# Altium footprint library SMD_SEMI.PcbLib: 101 footprints (part 1 of 7)
Each footprint in its own frame and in the unit in brackets; x right, y up, seen from the top. Pads: shape width x height; smd on the part's side, far side on the other; paste and mask are expansions set on the pad; w line width, h text height; cw(c..) or ccw(c..) is an arc to the next point about the centre after c.
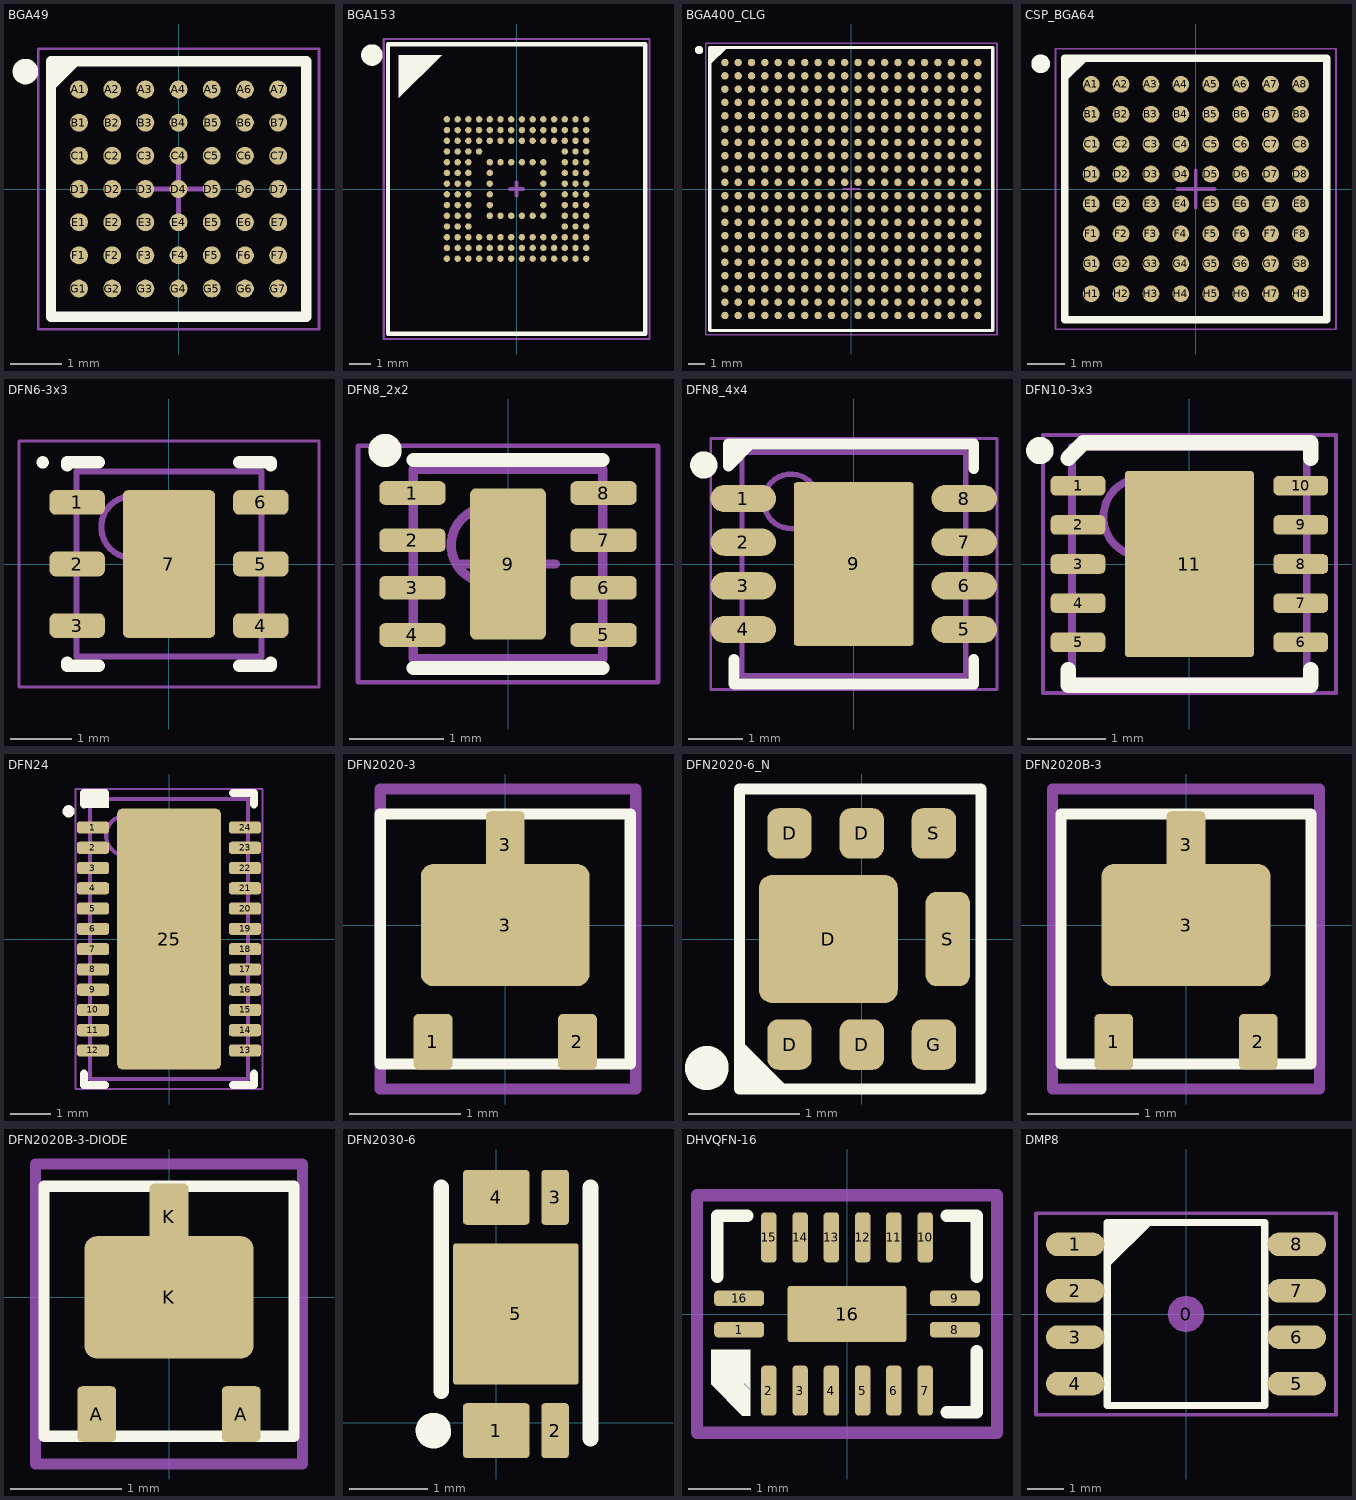
[diagram p0: the footprints below, top view; thin cyan lines are the x and y axes]

## BGA49 [mm] "BGA, 49-Leads, Body 5,00x5,00mmx1,38mm, Pitch 0,65mm"
height 1.38
pads (49):
  round 0.35 smd: A1(-1.95,1.95) A2(-1.3,1.95) A3(-0.65,1.95) A4(0,1.95) A5(0.65,1.95) A6(1.3,1.95) A7(1.95,1.95) B1(-1.95,1.3) B2(-1.3,1.3) B3(-0.65,1.3) B4(0,1.3) B5(0.65,1.3) B6(1.3,1.3) B7(1.95,1.3) C1(-1.95,0.65) C2(-1.3,0.65) C3(-0.65,0.65) C4(0,0.65) C5(0.65,0.65) C6(1.3,0.65) C7(1.95,0.65) D1(-1.95,0) D2(-1.3,0) D3(-0.65,0) D4(0,0) D5(0.65,0) D6(1.3,0) D7(1.95,0) E1(-1.95,-0.65) E2(-1.3,-0.65) E3(-0.65,-0.65) E4(0,-0.65) E5(0.65,-0.65) E6(1.3,-0.65) E7(1.95,-0.65) F1(-1.95,-1.3) F2(-1.3,-1.3) F3(-0.65,-1.3) F4(0,-1.3) F5(0.65,-1.3) F6(1.3,-1.3) F7(1.95,-1.3) G1(-1.95,-1.95) G2(-1.3,-1.95) G3(-0.65,-1.95) G4(0,-1.95) G5(0.65,-1.95) G6(1.3,-1.95) G7(1.95,-1.95)
Top Overlay:
  circle w0.25: c-3,2.3 r0.125
  region: -2.5,2.5 -1.885,2.5 -2.5,1.885
  region: -2.213,2.5 -2.5,2.213 -2.5,2.5
  lines w0.2: -2.5,2.213 -2.213,2.5 ; -2.5,-2.5 -2.5,2.5 2.5,2.5 2.5,-2.5 -2.5,-2.5
Mechanical 13:
  lines w0.1: -2.5,-2.5 -2.5,2.5 2.5,2.5 2.5,-2.5 -2.5,-2.5
Mechanical 15:
  lines w0.05: -2.75,-2.75 -2.75,2.75 2.75,2.75 2.75,-2.75 -2.75,-2.75
  lines w0.1: -0.5,0 0.5,0 ; 0,-0.5 0,0.5
3D body "BGA49.step": height 1.38, standoff 0, extent -2.5,-2.5 2.5,2.5

## BGA153 [mm]
pads (153):
  round 0.3 smd mask+0.025: A1(-3.25,3.25) A2(-2.75,3.25) A3(-2.25,3.25) A4(-1.75,3.25) A5(-1.25,3.25) A6(-0.75,3.25) A7(-0.25,3.25) A8(0.25,3.25) A9(0.75,3.25) A10(1.25,3.25) A11(1.75,3.25) A12(2.25,3.25) A13(2.75,3.25) A14(3.25,3.25) B1(-3.25,2.75) B2(-2.75,2.75) B3(-2.25,2.75) B4(-1.75,2.75) B5(-1.25,2.75) B6(-0.75,2.75) B7(-0.25,2.75) B8(0.25,2.75) B9(0.75,2.75) B10(1.25,2.75) B11(1.75,2.75) B12(2.25,2.75) B13(2.75,2.75) B14(3.25,2.75) C1(-3.25,2.25) C2(-2.75,2.25) C3(-2.25,2.25) C4(-1.75,2.25) C5(-1.25,2.25) C6(-0.75,2.25) C7(-0.25,2.25) C8(0.25,2.25) C9(0.75,2.25) C10(1.25,2.25) C11(1.75,2.25) C12(2.25,2.25) C13(2.75,2.25) C14(3.25,2.25) D1(-3.25,1.75) D2(-2.75,1.75) D3(-2.25,1.75) D4(-1.75,1.75) D12(2.25,1.75) D13(2.75,1.75) D14(3.25,1.75) E1(-3.25,1.25) E2(-2.75,1.25) E3(-2.25,1.25) E5(-1.25,1.25) E6(-0.75,1.25) E7(-0.25,1.25) E8(0.25,1.25) E9(0.75,1.25) E10(1.25,1.25) E12(2.25,1.25) E13(2.75,1.25) E14(3.25,1.25) F1(-3.25,0.75) F2(-2.75,0.75) F3(-2.25,0.75) F5(-1.25,0.75) F10(1.25,0.75) F12(2.25,0.75) F13(2.75,0.75) F14(3.25,0.75) G1(-3.25,0.25) G2(-2.75,0.25) G3(-2.25,0.25) G5(-1.25,0.25) G10(1.25,0.25) G12(2.25,0.25) G13(2.75,0.25) G14(3.25,0.25) H1(-3.25,-0.25) H2(-2.75,-0.25) H3(-2.25,-0.25) H5(-1.25,-0.25) H10(1.25,-0.25) H12(2.25,-0.25) H13(2.75,-0.25) H14(3.25,-0.25) J1(-3.25,-0.75) J2(-2.75,-0.75) J3(-2.25,-0.75) J5(-1.25,-0.75) J10(1.25,-0.75) J12(2.25,-0.75) J13(2.75,-0.75) J14(3.25,-0.75) K1(-3.25,-1.25) K2(-2.75,-1.25) K3(-2.25,-1.25) K5(-1.25,-1.25) K6(-0.75,-1.25) K7(-0.25,-1.25) K8(0.25,-1.25) K9(0.75,-1.25) K10(1.25,-1.25) K12(2.25,-1.25) K13(2.75,-1.25) K14(3.25,-1.25) L1(-3.25,-1.75) L2(-2.75,-1.75) L3(-2.25,-1.75) L12(2.25,-1.75) L13(2.75,-1.75) L14(3.25,-1.75) M1(-3.25,-2.25) M2(-2.75,-2.25) M3(-2.25,-2.25) M4(-1.75,-2.25) M5(-1.25,-2.25) M6(-0.75,-2.25) M7(-0.25,-2.25) M8(0.25,-2.25) M9(0.75,-2.25) M10(1.25,-2.25) M11(1.75,-2.25) M12(2.25,-2.25) M13(2.75,-2.25) M14(3.25,-2.25) N1(-3.25,-2.75) N2(-2.75,-2.75) N3(-2.25,-2.75) N4(-1.75,-2.75) N5(-1.25,-2.75) N6(-0.75,-2.75) N7(-0.25,-2.75) N8(0.25,-2.75) N9(0.75,-2.75) N10(1.25,-2.75) N11(1.75,-2.75) N12(2.25,-2.75) N13(2.75,-2.75) N14(3.25,-2.75) P1(-3.25,-3.25) P2(-2.75,-3.25) P3(-2.25,-3.25) P4(-1.75,-3.25) P5(-1.25,-3.25) P6(-0.75,-3.25) P7(-0.25,-3.25) P8(0.25,-3.25) P9(0.75,-3.25) P10(1.25,-3.25) P11(1.75,-3.25) P12(2.25,-3.25) P13(2.75,-3.25) P14(3.25,-3.25)
Top Overlay:
  circle w0.5: c-6.75,6.25 r0.25
  region: -5.5,6.25 -3.5,6.25 -5.5,4.25
  lines w0.2: -6,-6.75 6,-6.75 6,6.75 -6,6.75 -6,-6.75
Mechanical 15:
  lines w0.1: -6.2,-7 6.2,-7 6.2,7 -6.2,7 -6.2,-7
  lines w0.2: -0.3,0 0.3,0 ; 0,-0.3 0,0.3
3D body "User Library-153BallWFBGA.step": height 0.77, standoff -0.03, extent -5.75,-6.5 5.75,6.5

## BGA400_CLG [mm] "BGA, 400-Leads, Body 17,00x17,00mmx1,60mm, Pitch 0,80mm"
height 1.6
pads (400):
  round 0.45 smd: A1(-7.6,7.6) A2(-6.8,7.6) A3(-6,7.6) A4(-5.2,7.6) A5(-4.4,7.6) A6(-3.6,7.6) A7(-2.8,7.6) A8(-2,7.6) A9(-1.2,7.6) A10(-0.4,7.6) A11(0.4,7.6) A12(1.2,7.6) A13(2,7.6) A14(2.8,7.6) A15(3.6,7.6) A16(4.4,7.6) A17(5.2,7.6) A18(6,7.6) A19(6.8,7.6) A20(7.6,7.6) B1(-7.6,6.8) B2(-6.8,6.8) B3(-6,6.8) B4(-5.2,6.8) B5(-4.4,6.8) B6(-3.6,6.8) B7(-2.8,6.8) B8(-2,6.8) B9(-1.2,6.8) B10(-0.4,6.8) B11(0.4,6.8) B12(1.2,6.8) B13(2,6.8) B14(2.8,6.8) B15(3.6,6.8) B16(4.4,6.8) B17(5.2,6.8) B18(6,6.8) B19(6.8,6.8) B20(7.6,6.8) C1(-7.6,6) C2(-6.8,6) C3(-6,6) C4(-5.2,6) C5(-4.4,6) C6(-3.6,6) C7(-2.8,6) C8(-2,6) C9(-1.2,6) C10(-0.4,6) C11(0.4,6) C12(1.2,6) C13(2,6) C14(2.8,6) C15(3.6,6) C16(4.4,6) C17(5.2,6) C18(6,6) C19(6.8,6) C20(7.6,6) D1(-7.6,5.2) D2(-6.8,5.2) D3(-6,5.2) D4(-5.2,5.2) D5(-4.4,5.2) D6(-3.6,5.2) D7(-2.8,5.2) D8(-2,5.2) D9(-1.2,5.2) D10(-0.4,5.2) D11(0.4,5.2) D12(1.2,5.2) D13(2,5.2) D14(2.8,5.2) D15(3.6,5.2) D16(4.4,5.2) D17(5.2,5.2) D18(6,5.2) D19(6.8,5.2) D20(7.6,5.2) E1(-7.6,4.4) E2(-6.8,4.4) E3(-6,4.4) E4(-5.2,4.4) E5(-4.4,4.4) E6(-3.6,4.4) E7(-2.8,4.4) E8(-2,4.4) E9(-1.2,4.4) E10(-0.4,4.4) E11(0.4,4.4) E12(1.2,4.4) E13(2,4.4) E14(2.8,4.4) E15(3.6,4.4) E16(4.4,4.4) E17(5.2,4.4) E18(6,4.4) E19(6.8,4.4) E20(7.6,4.4) F1(-7.6,3.6) F2(-6.8,3.6) F3(-6,3.6) F4(-5.2,3.6) F5(-4.4,3.6) F6(-3.6,3.6) F7(-2.8,3.6) F8(-2,3.6) F9(-1.2,3.6) F10(-0.4,3.6) F11(0.4,3.6) F12(1.2,3.6) F13(2,3.6) F14(2.8,3.6) F15(3.6,3.6) F16(4.4,3.6) F17(5.2,3.6) F18(6,3.6) F19(6.8,3.6) F20(7.6,3.6) G1(-7.6,2.8) G2(-6.8,2.8) G3(-6,2.8) G4(-5.2,2.8) G5(-4.4,2.8) G6(-3.6,2.8) G7(-2.8,2.8) G8(-2,2.8) G9(-1.2,2.8) G10(-0.4,2.8) G11(0.4,2.8) G12(1.2,2.8) G13(2,2.8) G14(2.8,2.8) G15(3.6,2.8) G16(4.4,2.8) G17(5.2,2.8) G18(6,2.8) G19(6.8,2.8) G20(7.6,2.8) H1(-7.6,2) H2(-6.8,2) H3(-6,2) H4(-5.2,2) H5(-4.4,2) H6(-3.6,2) H7(-2.8,2) H8(-2,2) H9(-1.2,2) H10(-0.4,2) H11(0.4,2) H12(1.2,2) H13(2,2) H14(2.8,2) H15(3.6,2) H16(4.4,2) H17(5.2,2) H18(6,2) H19(6.8,2) H20(7.6,2) J1(-7.6,1.2) J2(-6.8,1.2) J3(-6,1.2) J4(-5.2,1.2) J5(-4.4,1.2) J6(-3.6,1.2) J7(-2.8,1.2) J8(-2,1.2) J9(-1.2,1.2) J10(-0.4,1.2) J11(0.4,1.2) J12(1.2,1.2) J13(2,1.2) J14(2.8,1.2) J15(3.6,1.2) J16(4.4,1.2) J17(5.2,1.2) J18(6,1.2) J19(6.8,1.2) J20(7.6,1.2) K1(-7.6,0.4) K2(-6.8,0.4) K3(-6,0.4) K4(-5.2,0.4) K5(-4.4,0.4) K6(-3.6,0.4) K7(-2.8,0.4) K8(-2,0.4) K9(-1.2,0.4) K10(-0.4,0.4) K11(0.4,0.4) K12(1.2,0.4) K13(2,0.4) K14(2.8,0.4) K15(3.6,0.4) K16(4.4,0.4) K17(5.2,0.4) K18(6,0.4) K19(6.8,0.4) K20(7.6,0.4) L1(-7.6,-0.4) L2(-6.8,-0.4) L3(-6,-0.4) L4(-5.2,-0.4) L5(-4.4,-0.4) L6(-3.6,-0.4) L7(-2.8,-0.4) L8(-2,-0.4) L9(-1.2,-0.4) L10(-0.4,-0.4) L11(0.4,-0.4) L12(1.2,-0.4) L13(2,-0.4) L14(2.8,-0.4) L15(3.6,-0.4) L16(4.4,-0.4) L17(5.2,-0.4) L18(6,-0.4) L19(6.8,-0.4) L20(7.6,-0.4) M1(-7.6,-1.2) M2(-6.8,-1.2) M3(-6,-1.2) M4(-5.2,-1.2) M5(-4.4,-1.2) M6(-3.6,-1.2) M7(-2.8,-1.2) M8(-2,-1.2) M9(-1.2,-1.2) M10(-0.4,-1.2) M11(0.4,-1.2) M12(1.2,-1.2) M13(2,-1.2) M14(2.8,-1.2) M15(3.6,-1.2) M16(4.4,-1.2) M17(5.2,-1.2) M18(6,-1.2) M19(6.8,-1.2) M20(7.6,-1.2) N1(-7.6,-2) N2(-6.8,-2) N3(-6,-2) N4(-5.2,-2) N5(-4.4,-2) N6(-3.6,-2) N7(-2.8,-2) N8(-2,-2) N9(-1.2,-2) N10(-0.4,-2) N11(0.4,-2) N12(1.2,-2) N13(2,-2) N14(2.8,-2) N15(3.6,-2) N16(4.4,-2) N17(5.2,-2) N18(6,-2) N19(6.8,-2) N20(7.6,-2) P1(-7.6,-2.8) P2(-6.8,-2.8) P3(-6,-2.8) P4(-5.2,-2.8) P5(-4.4,-2.8) P6(-3.6,-2.8) P7(-2.8,-2.8) P8(-2,-2.8) P9(-1.2,-2.8) P10(-0.4,-2.8) P11(0.4,-2.8) P12(1.2,-2.8) P13(2,-2.8) P14(2.8,-2.8) P15(3.6,-2.8) P16(4.4,-2.8) P17(5.2,-2.8) P18(6,-2.8) P19(6.8,-2.8) P20(7.6,-2.8) R1(-7.6,-3.6) R2(-6.8,-3.6) R3(-6,-3.6) R4(-5.2,-3.6) R5(-4.4,-3.6) R6(-3.6,-3.6) R7(-2.8,-3.6) R8(-2,-3.6) R9(-1.2,-3.6) R10(-0.4,-3.6) R11(0.4,-3.6) R12(1.2,-3.6) R13(2,-3.6) R14(2.8,-3.6) R15(3.6,-3.6) R16(4.4,-3.6) R17(5.2,-3.6) R18(6,-3.6) R19(6.8,-3.6) R20(7.6,-3.6) T1(-7.6,-4.4) T2(-6.8,-4.4) T3(-6,-4.4) T4(-5.2,-4.4) T5(-4.4,-4.4) T6(-3.6,-4.4) T7(-2.8,-4.4) T8(-2,-4.4) T9(-1.2,-4.4) T10(-0.4,-4.4) T11(0.4,-4.4) T12(1.2,-4.4) T13(2,-4.4) T14(2.8,-4.4) T15(3.6,-4.4) T16(4.4,-4.4) T17(5.2,-4.4) T18(6,-4.4) T19(6.8,-4.4) T20(7.6,-4.4) U1(-7.6,-5.2) U2(-6.8,-5.2) U3(-6,-5.2) U4(-5.2,-5.2) U5(-4.4,-5.2) U6(-3.6,-5.2) U7(-2.8,-5.2) U8(-2,-5.2) U9(-1.2,-5.2) U10(-0.4,-5.2) U11(0.4,-5.2) U12(1.2,-5.2) U13(2,-5.2) U14(2.8,-5.2) U15(3.6,-5.2) U16(4.4,-5.2) U17(5.2,-5.2) U18(6,-5.2) U19(6.8,-5.2) U20(7.6,-5.2) V1(-7.6,-6) V2(-6.8,-6) V3(-6,-6) V4(-5.2,-6) V5(-4.4,-6) V6(-3.6,-6) V7(-2.8,-6) V8(-2,-6) V9(-1.2,-6) V10(-0.4,-6) V11(0.4,-6) V12(1.2,-6) V13(2,-6) V14(2.8,-6) V15(3.6,-6) V16(4.4,-6) V17(5.2,-6) V18(6,-6) V19(6.8,-6) V20(7.6,-6) W1(-7.6,-6.8) W2(-6.8,-6.8) W3(-6,-6.8) W4(-5.2,-6.8) W5(-4.4,-6.8) W6(-3.6,-6.8) W7(-2.8,-6.8) W8(-2,-6.8) W9(-1.2,-6.8) W10(-0.4,-6.8) W11(0.4,-6.8) W12(1.2,-6.8) W13(2,-6.8) W14(2.8,-6.8) W15(3.6,-6.8) W16(4.4,-6.8) W17(5.2,-6.8) W18(6,-6.8) W19(6.8,-6.8) W20(7.6,-6.8) Y1(-7.6,-7.6) Y2(-6.8,-7.6) Y3(-6,-7.6) Y4(-5.2,-7.6) Y5(-4.4,-7.6) Y6(-3.6,-7.6) Y7(-2.8,-7.6) Y8(-2,-7.6) Y9(-1.2,-7.6) Y10(-0.4,-7.6) Y11(0.4,-7.6) Y12(1.2,-7.6) Y13(2,-7.6) Y14(2.8,-7.6) Y15(3.6,-7.6) Y16(4.4,-7.6) Y17(5.2,-7.6) Y18(6,-7.6) Y19(6.8,-7.6) Y20(7.6,-7.6)
Top Overlay:
  circle w0.25: c-9.15,8.35 r0.125
  region: -7.584,8.5 -8.5,7.584 -8.5,8.5
  lines w0.2: -8.5,7.584 -7.584,8.5 ; -8.5,-8.5 -8.5,8.5 8.5,8.5 8.5,-8.5 -8.5,-8.5
Mechanical 13:
  lines w0.1: -8.5,-8.5 -8.5,8.5 8.5,8.5 8.5,-8.5 -8.5,-8.5
Mechanical 15:
  lines w0.1: -0.5,0 0.5,0 ; 0,-0.5 0,0.5 ; -8.75,-8.75 -8.75,8.75 8.75,8.75 8.75,-8.75 -8.75,-8.75
3D body "BGA400_CLG.step": height 1.6, standoff 0, extent -8.5,-8.5 8.5,8.5

## CSP_BGA64 [mm] "BGA, 64-Leads, Body 7,00x7,00mmx2,00mm, Pitch 0,80mm"
height 2
pads (64):
  round 0.45 smd: A1(-2.8,2.8) A2(-2,2.8) A3(-1.2,2.8) A4(-0.4,2.8) A5(0.4,2.8) A6(1.2,2.8) A7(2,2.8) A8(2.8,2.8) B1(-2.8,2) B2(-2,2) B3(-1.2,2) B4(-0.4,2) B5(0.4,2) B6(1.2,2) B7(2,2) B8(2.8,2) C1(-2.8,1.2) C2(-2,1.2) C3(-1.2,1.2) C4(-0.4,1.2) C5(0.4,1.2) C6(1.2,1.2) C7(2,1.2) C8(2.8,1.2) D1(-2.8,0.4) D2(-2,0.4) D3(-1.2,0.4) D4(-0.4,0.4) D5(0.4,0.4) D6(1.2,0.4) D7(2,0.4) D8(2.8,0.4) E1(-2.8,-0.4) E2(-2,-0.4) E3(-1.2,-0.4) E4(-0.4,-0.4) E5(0.4,-0.4) E6(1.2,-0.4) E7(2,-0.4) E8(2.8,-0.4) F1(-2.8,-1.2) F2(-2,-1.2) F3(-1.2,-1.2) F4(-0.4,-1.2) F5(0.4,-1.2) F6(1.2,-1.2) F7(2,-1.2) F8(2.8,-1.2) G1(-2.8,-2) G2(-2,-2) G3(-1.2,-2) G4(-0.4,-2) G5(0.4,-2) G6(1.2,-2) G7(2,-2) G8(2.8,-2) H1(-2.8,-2.8) H2(-2,-2.8) H3(-1.2,-2.8) H4(-0.4,-2.8) H5(0.4,-2.8) H6(1.2,-2.8) H7(2,-2.8) H8(2.8,-2.8)
Top Overlay:
  circle w0.25: c-4.15,3.35 r0.125
  region: -2.984,3.5 -3.5,2.984 -3.5,3.5
  lines w0.2: -3.5,2.984 -2.984,3.5 ; -3.5,-3.5 3.5,-3.5 3.5,3.5 -3.5,3.5 -3.5,-3.5
Mechanical 13:
  lines w0.1: -3.5,-3.5 3.5,-3.5 3.5,3.5 -3.5,3.5 -3.5,-3.5
Mechanical 15:
  lines w0.05: -3.75,-3.75 3.75,-3.75 3.75,3.75 -3.75,3.75 -3.75,-3.75
  lines w0.1: -0.5,0 0.5,0 ; 0,-0.5 0,0.5
3D body "CSP_BGA64.step": height 2, standoff 0, extent -3.5,-3.5 3.5,3.5

## DFN6-3x3 [mm]
height 1.21
pads (7):
  rrect50% 0.9x0.4 smd: 1(-1.49,1) 2(-1.49,0) 3(-1.49,-1) 4(1.49,-1) 5(1.49,0) 6(1.49,1)
  rrect12% 1.5x2.4 smd: 7(0,0)
Top Overlay:
  circle w0.1: c-2.05,1.65 r0.05
  lines w0.2: -1.65,-1.6 -1.65,-1.65 -1.14,-1.65 ; -1.65,1.6 -1.65,1.65 -1.14,1.65 ; 1.14,-1.65 1.65,-1.65 1.65,-1.6 ; 1.14,1.65 1.65,1.65 1.65,1.6
Mechanical 13:
  circle w0.1: c-0.6,0.6 r0.5
  lines w0.1: -1.5,-1.5 -1.5,1.5 1.5,1.5 1.5,-1.5 -1.5,-1.5
Mechanical 15:
  lines w0.05: -2.435,-2 -2.435,2 2.435,2 2.435,-2 -2.435,-2
  lines w0.1: -0.5,0 0.5,0 ; 0,-0.5 0,0.5
3D body "DFN6-3x3_1.step": height 1.21, standoff 0, extent -1.6,-1.5 1.6,1.5

## DFN8_2x2 [mm] "SON, 8-Leads, Body 2.00x2.00mm, Pitch 0.50mm, Thermal Pad 1.60x0.80mm, IPC Medium Density"
height 0.9
pads (9):
  rrect50% 0.7x0.25 smd: 1(-1.01,0.75) 2(-1.01,0.25) 3(-1.01,-0.25) 4(-1.01,-0.75) 5(1.01,-0.75) 6(1.01,-0.25) 7(1.01,0.25) 8(1.01,0.75)
  rrect15% 0.8x1.6 smd: 9(0,0)
Top Overlay:
  circle w0.25: c-1.3,1.2 r0.05
  lines w0.15: -1,-1.1 1,-1.1 ; -1,1.1 1,1.1
Mechanical 13:
  circle w0.1: c-0.2,0.2 r0.4
  lines w0.1: -1,-1 -1,1 1,1 1,-1 -1,-1
Mechanical 15:
  lines w0.05: -1.585,-1.25 -1.585,1.25 1.585,1.25 1.585,-1.25 -1.585,-1.25
  lines w0.1: -0.5,0 0.5,0 ; 0,-0.5 0,0.5
3D body "DFN8_2x2.step": height 0.9, standoff 0, extent -1.1,-1 1.1,1

## DFN8_4x4 [mm] "SON, 8-Leads, Body 4x4mm, Pitch 0.8mm, Thermal Pad 3x2.2mm, IPC Medium Density"
height 1
pads (9):
  oval 1.2x0.5 smd: 1(-2.027,1.2) 2(-2.027,0.4) 3(-2.027,-0.4) 4(-2.027,-1.2) 5(2.027,-1.2) 6(2.027,-0.4) 7(2.027,0.4) 8(2.027,1.2)
  rrect5% 2.2x3 smd: 9(0,0)
Top Overlay:
  circle w0.25: c-2.75,1.816 r0.125
  region: -2.3,2.2 -1.9,2.2 -2.3,1.8
  lines w0.2: -2.2,-1.75 -2.2,-2.2 -1.525,-2.2 1.525,-2.2 2.2,-2.2 2.2,-1.75 ; -2.127,1.973 -2.3,1.8 ; 2.2,1.75 2.2,2.2 1.525,2.2 -1.7,2.2 -1.9,2.2 ; -2.3,1.8 -2.3,2.2 -1.9,2.2 ; -2.3,1.8 -2.3,1.8 ; -2.3,1.8 -1.9,2.2
Mechanical 13:
  circle w0.1: c-1.15,1.15 r0.5
  lines w0.1: -2.05,-2.05 -2.05,2.05 2.05,2.05 2.05,-2.05 -2.05,-2.05
Mechanical 15:
  lines w0.05: -2.625,-2.3 -2.625,2.3 2.625,2.3 2.625,-2.3 -2.625,-2.3
  lines w0.1: -0.5,0 0.5,0 ; 0,-0.5 0,0.5
3D body "SON8.step": height 1, standoff 0, extent -2.15,-2.05 2.15,2.05

## DFN10-3x3 [mm] "SON, 10-Leads, Body 3x3mm, Pitch 0.5mm, Thermal Pad 2.38x1.65mm"
height 0.8
pads (11):
  rrect50% 0.7x0.25 smd: 1(-1.425,1) 2(-1.425,0.5) 3(-1.425,0) 4(-1.425,-0.5) 5(-1.425,-1) 6(1.425,-1) 7(1.425,-0.5) 8(1.425,0) 9(1.425,0.5) 10(1.425,1)
  rrect5% 1.65x2.38 smd: 11(0,0)
Top Overlay:
  circle w0.25: c-1.913,1.452 r0.05
  lines w0.2: -1.55,-1.525 -1.55,-1.55 ; -1.55,-1.355 -1.55,-1.55 ; -1.55,1.355 -1.355,1.55 1.362,1.55 ; 1.175,1.55 1.55,1.55 ; 1.55,-1.525 1.55,-1.55 ; 1.55,-1.355 1.55,-1.55 ; 1.55,1.355 1.55,1.55 ; 1.55,1.525 1.55,1.55 ; -1.55,-1.55 1.175,-1.55 1.55,-1.55
Mechanical 13:
  circle w0.1: c-0.6,0.6 r0.5
  lines w0.1: -1.5,-1.5 1.5,-1.5 1.5,1.5 -1.5,1.5 -1.5,-1.5
Mechanical 15:
  lines w0.05: -1.875,-1.65 1.875,-1.65 1.875,1.65 -1.875,1.65 -1.875,-1.65
3D body "User Library-DFN-10.STEP": height 0.8, standoff 0, extent -1.51,-1.5 1.49,1.5

## DFN24 [mm]
height 0.8
pads (25):
  rrect50% 0.8x0.3 smd: 1(-1.875,2.75) 2(-1.875,2.25) 3(-1.875,1.75) 4(-1.875,1.25) 5(-1.875,0.75) 6(-1.875,0.25) 7(-1.875,-0.25) 8(-1.875,-0.75) 9(-1.875,-1.25) 10(-1.875,-1.75) 11(-1.875,-2.25) 12(-1.875,-2.75) 13(1.875,-2.75) 14(1.875,-2.25) 15(1.875,-1.75) 16(1.875,-1.25) 17(1.875,-0.75) 18(1.875,-0.25) 19(1.875,0.25) 20(1.875,0.75) 21(1.875,1.25) 22(1.875,1.75) 23(1.875,2.25) 24(1.875,2.75)
  rrect10% 2.56x6.43 smd paste-1.28: 25(0,0)
Top Overlay:
  circle w0.2: c-2.475,3.15 r0.05
  rectangle: -2.1,3.226 -1.48,3.6
  lines w0.2: -2.1,-3.325 -2.1,-3.6 -1.58,-3.6 ; -2.1,3.325 -2.1,3.6 -1.58,3.6 ; 1.58,-3.6 2.1,-3.6 2.1,-3.325 ; 1.58,3.6 2.1,3.6 2.1,3.325
Top Paste:
  rectangle: -1.18,2.035 -0.1,3.125
  rectangle: -1.18,0.745 -0.1,1.835
  rectangle: -1.18,-0.545 -0.1,0.545
  rectangle: -1.18,-1.835 -0.1,-0.745
  rectangle: -1.18,-3.125 -0.1,-2.035
  rectangle: 0.1,2.035 1.18,3.125
  rectangle: 0.1,0.745 1.18,1.835
  rectangle: 0.1,-0.545 1.18,0.545
  rectangle: 0.1,-1.835 1.18,-0.745
  rectangle: 0.1,-3.125 1.18,-2.035
Mechanical 13:
  circle w0.1: c-1.05,2.55 r0.5
  lines w0.1: -1.95,-3.45 -1.95,3.45 1.95,3.45 1.95,-3.45 -1.95,-3.45
Mechanical 15:
  lines w0.05: -2.305,-3.7 -2.305,3.7 2.305,3.7 2.305,-3.7 -2.305,-3.7
  lines w0.1: -0.5,0 0.5,0 ; 0,-0.5 0,0.5
3D body "DFN24.step": height 0.8, standoff 0, extent -1.951,-3.45 1.951,3.45

## DFN2020-3 [mm] "SOT23, 3 pin"
height 1.003
pads (4):
  rrect25% 0.35x0.5 smd: 1(-0.65,-1.05) 2(0.65,-1.05)
  rrect20% 1.52x1.1 smd: 3(0,0)
  rrect25% 0.35x0.6 smd: 3(0,0.725)
Top Overlay:
  lines w0.1: -1.125,-1.25 1.125,-1.25 1.125,1 -1.125,1 -1.125,-1.25
Mechanical 15:
  lines w0.1: -1.125,-1.475 1.175,-1.475 1.175,1.225 -1.125,1.225 -1.125,-1.475
3D body "DFN2020B-3.STEP": height 0.58, standoff -0.02, extent -1,-1.125 1,0.875

## DFN2020-6_N [mm]
pads (8):
  rrect50% 0.4x0.455 smd paste-4: D(-0.65,-0.95) D(-0.65,0.95) D(0,-0.95) D(0,0.95) G(0.65,-0.95) S(0.65,0.95)
  rrect20% 1.25x1.15 smd paste-4: D(-0.3,0)
  rrect50% 0.4x0.85 smd paste-4: S(0.775,0)
Top Overlay:
  region: -1.1,-1.35 -0.65,-1.35 -1.1,-0.9
  lines w0.1: -1.1,-1.35 1.075,-1.35 1.075,1.35 -1.1,1.35 -1.1,-1.35
  lines w0.254: -1.325,-1.175 cw(c-1.394,-1.161) -1.325,-1.15
3D body "DFN2020-6.STEP": height 0.65, standoff 0, extent -1,-1 1,1

## DFN2020B-3 [mm] "SOT23, 3 pin"
height 1.003
pads (4):
  rrect25% 0.35x0.5 smd: 1(-0.65,-1.05) 2(0.65,-1.05)
  rrect20% 1.52x1.1 smd: 3(0,0)
  rrect25% 0.35x0.6 smd: 3(0,0.725)
Top Overlay:
  lines w0.1: -1.125,-1.25 -1.125,1 1.125,1 1.125,-1.25 -1.125,-1.25
Mechanical 15:
  lines w0.1: -1.2,-1.475 -1.2,1.225 1.2,1.225 1.2,-1.475 -1.2,-1.475
3D body "DFN2020B-3.STEP": height 0.58, standoff -0.02, extent -1,-1.125 1,0.875

## DFN2020B-3-DIODE [mm] "SOT23, 3 pin"
height 1.003
pads (4):
  rrect25% 0.35x0.5 smd: A(-0.65,-1.05) A(0.65,-1.05)
  rrect20% 1.52x1.1 smd: K(0,0)
  rrect25% 0.35x0.6 smd: K(0,0.725)
Top Overlay:
  lines w0.1: -1.125,-1.25 1.125,-1.25 1.125,1 -1.125,1 -1.125,-1.25
Mechanical 15:
  lines w0.1: -1.2,-1.5 1.2,-1.5 1.2,1.2 -1.2,1.2 -1.2,-1.5
3D body "DFN2020B-3.STEP": height 0.58, standoff -0.02, extent -1,-1.125 1,0.875

## DFN2030-6 [mm]
height 0.8
pads (5):
  rrect15% 0.85x0.7 smd paste-0.05: 1(0,-0.1) 4(0,2.87)
  rrect25% 0.35x0.7 smd paste-0.05: 2(0.75,-0.1) 3(0.75,2.87)
  rrect5% 1.6x1.8 smd paste-0.1: 5(0.25,1.385)
Top Overlay:
  lines w0.2: -0.7,0.4 -0.7,3 ; 1.2,-0.2 1.2,3
  lines w0.254: -0.711,-0.055 ccw(c-0.8,-0.1) -0.7,-0.1
3D body: height 0.51, standoff 0.03, extent -0.652,-0.2 1.152,3

## DHVQFN-16 [mm]
pads (17):
  rrect50% 0.8x0.25 smd paste-0.025 mask+0.025: 1(-1.725,-0.25) 8(1.725,-0.25) 9(1.725,0.25) 16(-1.725,0.25)
  rrect50% 0.25x0.8 smd paste-0.025 mask+0.025: 2(-1.25,-1.225) 3(-0.75,-1.225) 4(-0.25,-1.225) 5(0.25,-1.225) 6(0.75,-1.225) 7(1.25,-1.225) 10(1.25,1.225) 11(0.75,1.225) 12(0.25,1.225) 13(-0.25,1.225) 14(-0.75,1.225) 15(-1.25,1.225)
  rrect10% 1.9x0.9 smd paste-1 mask+0.025: 16(0,0)
Top Overlay:
  region: -2.175,-0.575 -1.55,-1.2 -1.55,-1.625 -1.675,-1.625 -2.175,-1.125 -2.175,-0.575 -1.55,-0.575 -1.55,-1.222
  lines w0.2: -2.075,0.6 -2.075,1.575 -1.6,1.575 ; 1.6,-1.575 2.075,-1.575 2.075,-0.6 ; 1.6,1.575 2.075,1.575 2.075,0.6
Top Paste:
  region: 0.55,0.225 0.125,0.225 0.125,-0.2 0.55,-0.2
  rectangle: -0.55,-0.2 -0.125,0.225
Mechanical 15:
  lines w0.2: -2.4,-1.9 2.4,-1.9 2.4,1.9 -2.4,1.9 -2.4,-1.9
3D body "User Library-DHVQFN 16.step": height 1.03, standoff -0.02, extent -1.81,-1.31 1.81,1.31

## DMP8 [mm] "8-Leads, Body 5.00x5.00mm, Pitch 1.27mm, IPC Medium Density"
height 1.6
pads (9):
  round 1 on Mech15: 0(0,0)
  oval 1.6x0.65 smd: 1(-3.025,1.905) 2(-3.025,0.635) 3(-3.025,-0.635) 4(-3.025,-1.905) 5(3.025,-1.905) 6(3.025,-0.635) 7(3.025,0.635) 8(3.025,1.905)
Top Overlay:
  region: -2.15,2.5 -0.9,2.5 -2.15,1.25
  lines w0.2: -2.15,-2.5 -2.15,2.5 2.15,2.5 2.15,-2.5 -2.15,-2.5
Mechanical 15:
  lines w0.1: -4.1,-2.75 4.1,-2.75 4.1,2.75 -4.1,2.75 -4.1,-2.75
3D body "DMP8.step": height 1.6, standoff 0, extent -3.35,-2.5 3.35,2.5